# Altium footprint library andylib.PcbLib: 158 footprints (part 5 of 10)
Each footprint in its own frame and in the unit in brackets; x right, y up, seen from the top. Pads: shape width x height; smd on the part's side, far side on the other; paste and mask are expansions set on the pad; w line width, h text height; cw(c..) or ccw(c..) is an arc to the next point about the centre after c.
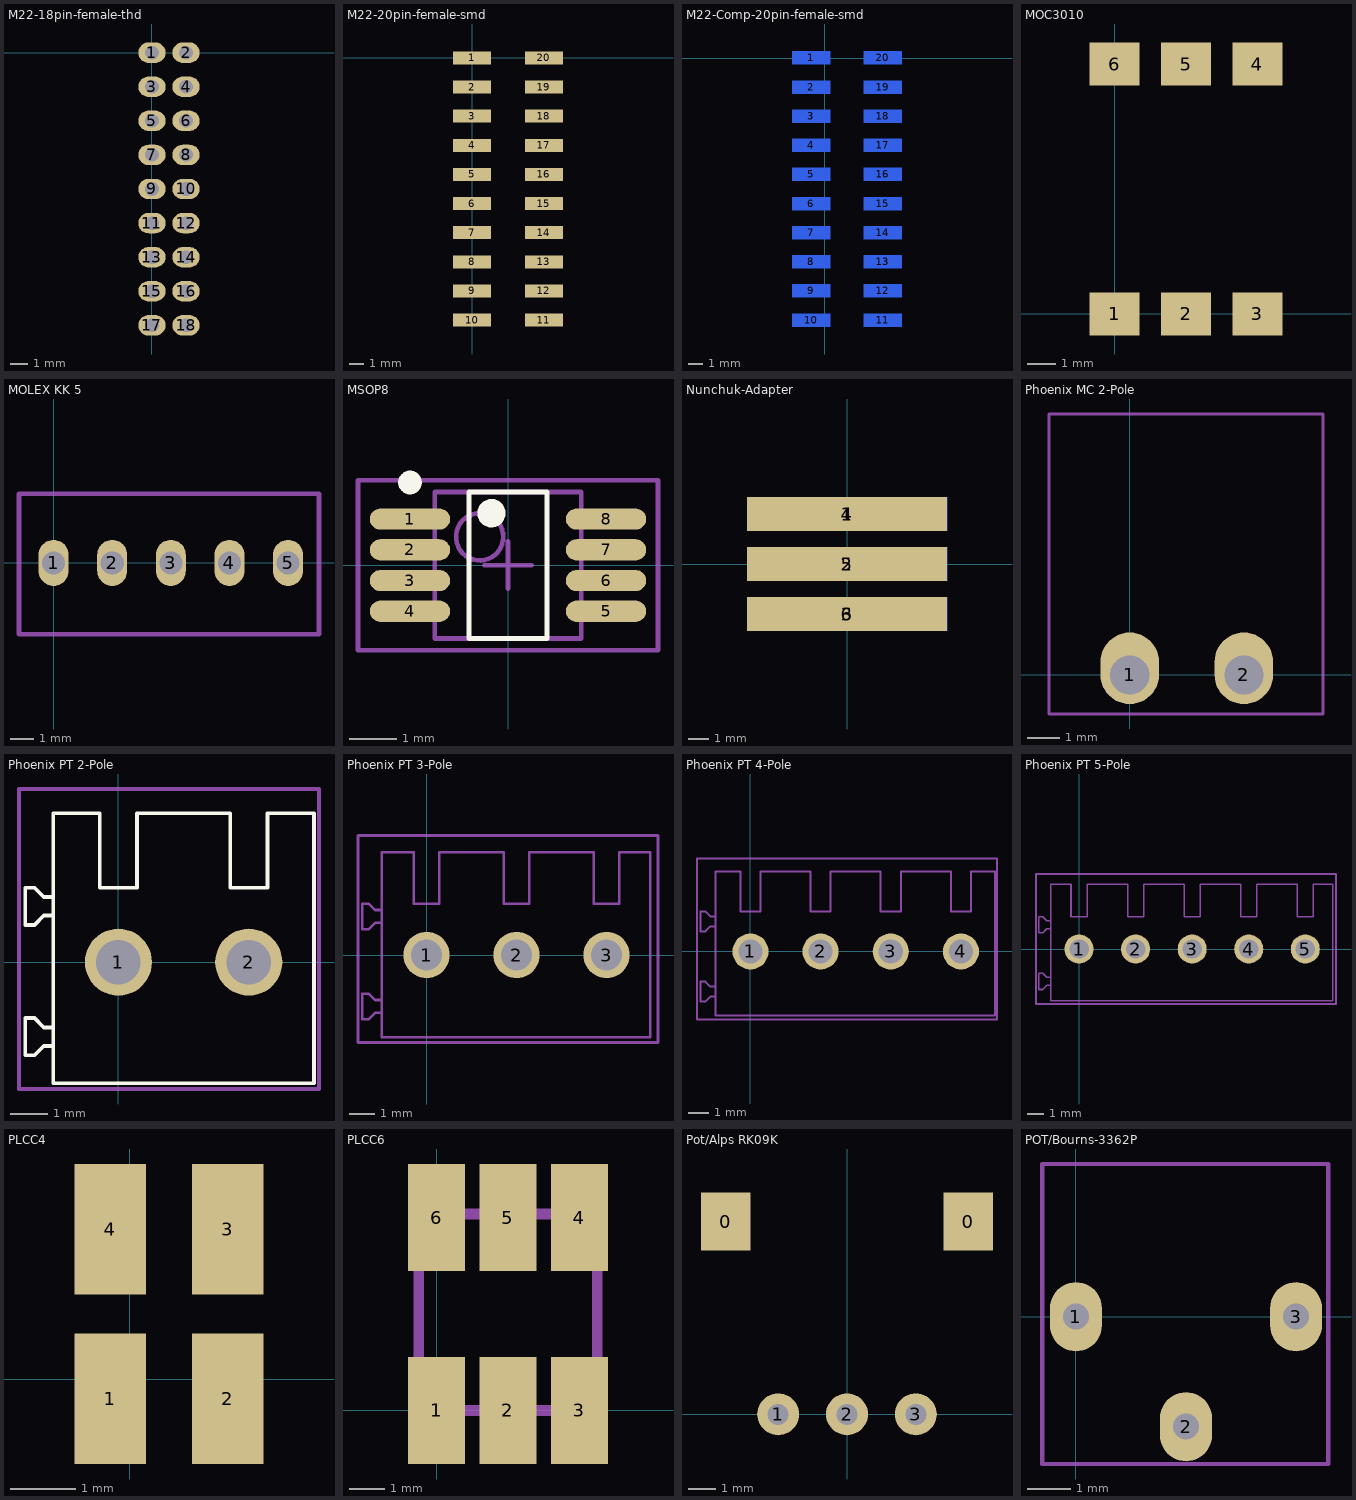
[diagram p4: the footprints below, top view; thin cyan lines are the x and y axes]

## M22-18pin-female-thd [mm] "Molex 791077058"
pads (18):
  oval 1.6x1.2 hole 0.8: 1(0,0) 2(2,0) 3(0,-2) 4(2,-2) 5(0,-4) 6(2,-4) 7(0,-6) 8(2,-6) 9(0,-8) 10(2,-8) 11(0,-10) 12(2,-10) 13(0,-12) 14(2,-12) 15(0,-14) 16(2,-14) 17(0,-16) 18(2,-16)
3D body: height 4.44, standoff -3, extent -1.095,-17.095 3.095,1.095

## M22-20pin-female-smd [mm]
pads (20):
  rect 2.6x0.89 smd: 1(0,0) 2(0,-2) 3(0,-4) 4(0,-6) 5(0,-8) 6(0,-10) 7(0,-12) 8(0,-14) 9(0,-16) 10(0,-18) 11(4.93,-18) 12(4.93,-16) 13(4.93,-14) 14(4.93,-12) 15(4.93,-10) 16(4.93,-8) 17(4.93,-6) 18(4.93,-4) 19(4.93,-2) 20(4.93,0)
3D body: height 4.46, standoff -0.03, extent -0.75,-19.2 5.754,1.3

## M22-Comp-20pin-female-smd [mm] "Mating footprint for sensor boards"
pads (20):
  rect 2.6x0.89 smd far side: 1(-0.925,0.025) 2(-0.925,-1.975) 3(-0.925,-3.975) 4(-0.925,-5.975) 5(-0.925,-7.975) 6(-0.925,-9.975) 7(-0.925,-11.975) 8(-0.925,-13.975) 9(-0.925,-15.975) 10(-0.925,-17.975) 11(4.005,-17.975) 12(4.005,-15.975) 13(4.005,-13.975) 14(4.005,-11.975) 15(4.005,-9.975) 16(4.005,-7.975) 17(4.005,-5.975) 18(4.005,-3.975) 19(4.005,-1.975) 20(4.005,0.025)
3D body: height 4.5, standoff 0, extent -1.675,-19.175 4.829,1.325

## MOC3010 [mm] "Optocoupler for TRIACs"
pads (6):
  rect 1.78x1.52 smd: 1(0,0) 2(2.54,0) 3(5.08,0) 4(5.08,8.89) 5(2.54,8.89) 6(0,8.89)
3D body: height 5.12, standoff 0, extent -1.945,-0.552 6.945,9.352

## MOLEX KK 5 [mm] "Molex KK Series - 22-23-2051"
pads (5):
  oval 1.3x2 hole 1: 1(0,0) 2(2.54,0) 3(5.08,0) 4(7.62,0) 5(10.16,0)
Mechanical 13:
  lines w0.2: -1.5,-3.1 11.5,-3.1 11.5,3 -1.5,3 -1.5,-3.1
3D body: height 11.68, standoff -3.56, extent -1.35,-2.972 11.35,2.87

## MSOP8 [mm] "TSOP, 8-Leads, Body 3.1x3.1mm (max), Pitch 0.65mm, IPC Medium Density"
height 1.1
pads (8):
  oval 1.7x0.45 smd: 1(-2.075,0.975) 2(-2.075,0.325) 3(-2.075,-0.325) 4(-2.075,-0.975) 5(2.075,-0.975) 6(2.075,-0.325) 7(2.075,0.325) 8(2.075,0.975)
Top Overlay:
  circle w0.3: c-0.35,1.1 r0.15
  circle w0.25: c-2.075,1.75 r0.125
  lines w0.1: -0.825,-1.55 0.825,-1.55 0.825,1.55 -0.825,1.55 -0.825,-1.55
Mechanical 13:
  circle w0.1: c-0.6,0.6 r0.5
  lines w0.1: -1.55,-1.55 1.55,-1.55 1.55,1.55 -1.55,1.55 -1.55,-1.55
Mechanical 15:
  lines w0.1: -0.5,0 0.5,0 ; 0,-0.5 0,0.5 ; -3.175,-1.8 3.175,-1.8 3.175,1.8 -3.175,1.8 -3.175,-1.8
3D body: height 1.1, standoff 0.2, extent -1.55,-1.55 1.55,1.55
3D body: height 1.1, standoff 0, extent -2.369,-1.55 2.569,1.55

## Nunchuk-Adapter [mm] "Wii Nunchuk Board Edge Adapter"
pads (6):
  rect 10x1.7 smd paste+0 mask+0: 1(0,2.5) 2(0,0) 3(0,-2.5)
  rect 10x1.7 smd far side paste+0 mask+0: 4(0,2.5) 5(0,0) 6(0,-2.5)

## Phoenix MC 2-Pole [mm] "MC 1,5/ 2-G-3,5 - Ref 1844210"
pads (2):
  oval 1.8x2.2 hole 1.2 copper offset 0,0.2: 1(0,0) 2(3.5,0)
Mechanical 13:
  lines w0.1: -2.475,-1.2 5.925,-1.2 5.925,8 -2.475,8 -2.475,-1.2
3D body: height 7.25, standoff -3.4, extent -2.45,-1.2 5.95,8

## Phoenix PT 2-Pole [mm] "PT 1,5/ 2-3,5-H - Ref 1984617"
pads (2):
  round 1.8 hole 1.2: 1(0,0) 2(3.5,0)
Top Overlay:
  lines w0.1: -1.75,-2.25 -2,-2.25 -2.25,-2.5 -2.5,-2.5 -2.5,-1.5 -2.25,-1.5 -2,-1.75 -1.75,-1.75 ; -1.75,1.25 -2,1.25 -2.25,1 -2.5,1 -2.5,2 -2.25,2 -2,1.75 -1.75,1.75 ; -1.75,-3.25 5.25,-3.25 5.25,3.25 5.25,4 4,4 4,2 3,2 3,4 0.5,4 0.5,2 -0.5,2 -0.5,3.25 -0.5,4 -1.75,4 -1.75,3.25 -1.75,-3.25 ; -1.75,-1.25 -1.75,-1.25
Mechanical 15:
  lines w0.1: -2.667,-3.404 5.385,-3.404 5.385,4.648 -2.667,4.648 -2.667,-3.404
3D body: height 9, standoff -4.5, extent -2.285,-3.1 5.285,4.5

## Phoenix PT 3-Pole [mm] "PT 1,5/ 3-3,5-H - Ref 1984620"
pads (3):
  round 1.8 hole 1.2: 1(0,0) 2(3.5,0) 3(7,0)
Mechanical 13:
  lines w0.1: -1.75,-2.25 -2,-2.25 -2.25,-2.5 -2.5,-2.5 -2.5,-1.5 -2.25,-1.5 -2,-1.75 -1.75,-1.75 ; -1.75,1.25 -2,1.25 -2.25,1 -2.5,1 -2.5,2 -2.25,2 -2,1.75 -1.75,1.75 ; -1.75,-3.2 -1.75,3.25 -1.75,4 -0.5,4 -0.5,3.25 -0.5,2 0.5,2 0.5,4 3,4 3,2 4,2 4,4 6.5,4 6.5,2 7.5,2 7.5,4 8.7,4 8.7,-3.2 -1.75,-3.2 ; -1.75,-1.25 -1.75,-1.25
Mechanical 15:
  lines w0.1: -2.667,-3.404 -2.667,4.648 9,4.648 9,-3.404 -2.667,-3.404
3D body: height 9, standoff -4.5, extent -2.285,-3.1 8.785,4.5

## Phoenix PT 4-Pole [mm] "PT 1,5/ 4-3,5-H - Ref 1984633"
pads (4):
  round 1.8 hole 1.2: 1(0,0) 2(3.5,0) 3(7,0) 4(10.5,0)
Mechanical 13:
  lines w0.1: -1.75,-2.25 -2,-2.25 -2.25,-2.5 -2.5,-2.5 -2.5,-1.5 -2.25,-1.5 -2,-1.75 -1.75,-1.75 ; -1.75,1.25 -2,1.25 -2.25,1 -2.5,1 -2.5,2 -2.25,2 -2,1.75 -1.75,1.75 ; 7.5,2 6.5,2 6.5,4 4,4 4,2 3,2 3,4 0.5,4 0.5,2 -0.5,2 -0.5,3.25 -0.5,4 -1.75,4 -1.75,3.25 -1.75,-3.2 12.2,-3.2 12.2,4 11,4 11,2 10,2 10,4 7.5,4 ; 7.5,2 7.5,4 ; 7.5,2 7.5,4 ; -1.75,-1.25 -1.75,-1.25
Mechanical 15:
  lines w0.1: -2.667,-3.404 -2.667,4.648 12.3,4.648 12.3,-3.404 -2.667,-3.404
3D body: height 9, standoff -4.5, extent -2.285,-3.1 12.285,4.5

## Phoenix PT 5-Pole [mm] "PT 1,5/ 4-3,5-H - Ref 1984633"
pads (5):
  round 1.8 hole 1.2: 1(0,0) 2(3.5,0) 3(7,0) 4(10.5,0) 5(14,0)
Mechanical 13:
  lines w0.1: -1.75,-2.25 -2,-2.25 -2.25,-2.5 -2.5,-2.5 -2.5,-1.5 -2.25,-1.5 -2,-1.75 -1.75,-1.75 ; -1.75,1.25 -2,1.25 -2.25,1 -2.5,1 -2.5,2 -2.25,2 -2,1.75 -1.75,1.75 ; 7.5,2 6.5,2 6.5,4 4,4 4,2 3,2 3,4 0.5,4 0.5,2 -0.5,2 -0.5,3.25 -0.5,4 -1.75,4 -1.75,3.25 -1.75,-3.2 15.7,-3.2 15.7,4 14.5,4 14.5,2 13.5,2 13.5,4 11,4 11,2 10,2 10,4 7.5,4 ; 7.5,2 7.5,4 ; 7.5,2 7.5,4 ; -1.75,-1.25 -1.75,-1.25
Mechanical 15:
  lines w0.1: -2.667,-3.404 -2.667,4.648 15.9,4.648 15.9,-3.404 -2.667,-3.404
3D body: height 9, standoff -4.5, extent -2.285,-3.1 15.785,4.5

## PLCC4 [mm]
pads (4):
  rect 1.1x2 smd: 1(-0.3,-0.3) 2(1.5,-0.3) 3(1.5,2.3) 4(-0.3,2.3)
3D body: height 1.95, standoff 0, extent -0.8,-0.75 2,2.75

## PLCC6 [mm]
pads (6):
  rect 1.6x3 smd: 1(0,0) 2(2,0) 3(4,0) 4(4,5.4) 5(2,5.4) 6(0,5.4)
Mechanical 15:
  lines w0.3: -0.5,1.3 0.7,0 ; -0.5,0 4.5,0 4.5,5.5 -0.5,5.5 -0.5,0
3D body: height 2.6, standoff 0, extent -0.725,-0.05 4.775,5.45

## Pot/Alps RK09K [mm] "Alps 9mm Potentiometer, through hole"
pads (5):
  rect 1.8x2.1 smd: 0(-4.4,7) 0(4.4,7)
  round 1.524 hole 0.762: 1(-2.5,0) 2(0,0) 3(2.5,0)
Mechanical 13:
  text "/!\ Holes missing" at -6,-2.5 h1
3D body: height 19.52, standoff -4.28, extent -4.876,-0.1 4.876,12.45

## POT/Bourns-3362P [mm] "1/4\" Trim Pot - through hole"
height 4.7
pads (3):
  oval 1.2x1.6 hole 0.6: 1(0,0) 2(2.54,-2.54) 3(5.08,0)
Mechanical 13:
  lines w0.1: -0.775,3.5 -0.775,-3.4 5.825,-3.4 5.825,3.5 ; -0.775,3.525 5.825,3.525
3D body: height 4.4, standoff -3, extent -0.75,-3.3 5.85,3.3